# Altium footprint library 逸芬的库鸭.PcbLib: 255 footprints (part 9 of 20)
Each footprint in its own frame and in the unit in brackets; x right, y up, seen from the top. Pads: shape width x height; smd on the part's side, far side on the other; paste and mask are expansions set on the pad; w line width, h text height; cw(c..) or ccw(c..) is an arc to the next point about the centre after c.
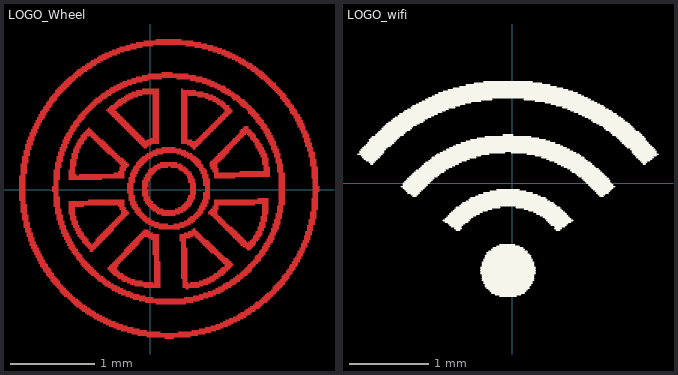
[diagram p8: the footprints below, top view; thin cyan lines are the x and y axes]

## LOGO_Wheel [mm]
Top Layer:
  lines w0.018: -1.554,-0.124 -1.483,-0.124 ; -1.554,-0.107 -1.483,-0.107 ; -1.554,-0.089 -1.483,-0.089 ; -1.554,-0.071 -1.483,-0.071 ; -1.554,-0.053 -1.483,-0.053 ; -1.554,-0.036 -1.483,-0.036 ; -1.554,-0.018 -1.483,-0.018 ; -1.554,0 -1.483,0 ; -1.554,0.018 -1.483,0.018 ; -1.554,0.036 -1.483,0.036 ; -1.554,0.053 -1.483,0.053 ; -1.554,0.071 -1.483,0.071 ; -1.554,0.089 -1.483,0.089 ; -1.554,0.107 -1.483,0.107 ; -1.554,0.124 -1.483,0.124 ; -1.554,0.142 -1.483,0.142 ; -1.554,0.16 -1.483,0.16 ; -1.537,-0.267 -1.466,-0.267 ; -1.537,-0.249 -1.466,-0.249 ; -1.537,-0.231 -1.466,-0.231 ; -1.537,-0.213 -1.466,-0.213 ; -1.537,-0.196 -1.466,-0.196 ; -1.537,-0.178 -1.466,-0.178 ; -1.537,-0.16 -1.483,-0.16 ; -1.537,-0.142 -1.483,-0.142 ; -1.537,0.178 -1.483,0.178 ; -1.537,0.196 -1.466,0.196 ; -1.537,0.213 -1.466,0.213 ; -1.537,0.231 -1.466,0.231 ; -1.537,0.249 -1.466,0.249 ; -1.537,0.267 -1.466,0.267 ; -1.537,0.284 -1.466,0.284 ; -1.537,0.302 -1.466,0.302 ; -1.519,-0.356 -1.448,-0.356 ; -1.519,-0.338 -1.448,-0.338 ; -1.519,-0.32 -1.448,-0.32 ; -1.519,-0.302 -1.448,-0.302 ; -1.519,-0.284 -1.466,-0.284 ; -1.519,0.32 -1.448,0.32 ; -1.519,0.338 -1.448,0.338 ; -1.519,0.356 -1.448,0.356 ; -1.519,0.373 -1.448,0.373 ; -1.519,0.391 -1.448,0.391 ; -1.501,-0.445 -1.43,-0.445 ; -1.501,-0.427 -1.43,-0.427 ; -1.501,-0.409 -1.43,-0.409 ; -1.501,-0.391 -1.43,-0.391 ; -1.501,-0.373 -1.448,-0.373 ; -1.501,0.409 -1.43,0.409 ; -1.501,0.427 -1.43,0.427 ; -1.501,0.445 -1.43,0.445 ; -1.501,0.462 -1.43,0.462 ; -1.483,-0.498 -1.412,-0.498 ; -1.483,-0.48 -1.412,-0.48 ; -1.483,-0.462 -1.412,-0.462 ; -1.483,0.48 -1.412,0.48 ; -1.483,0.498 -1.412,0.498 ; -1.483,0.516 -1.412,0.516 ; -1.483,0.533 -1.394,0.533 ; -1.466,-0.551 -1.394,-0.551 ; -1.466,-0.533 -1.394,-0.533 ; -1.466,-0.516 -1.394,-0.516 ; -1.466,0.551 -1.394,0.551 ; -1.466,0.569 -1.394,0.569 ; -1.466,0.587 -1.377,0.587 ; -1.448,-0.605 -1.377,-0.605 ; -1.448,-0.587 -1.377,-0.587 ; -1.448,-0.569 -1.377,-0.569 ; -1.448,0.605 -1.377,0.605 ; -1.448,0.622 -1.377,0.622 ; -1.43,-0.658 -1.341,-0.658 ; -1.43,-0.64 -1.359,-0.64 ; -1.43,-0.622 -1.359,-0.622 ; -1.43,0.64 -1.359,0.64 ; -1.43,0.658 -1.359,0.658 ; -1.43,0.676 -1.341,0.676 ; -1.412,-0.693 -1.323,-0.693 ; -1.412,-0.676 -1.341,-0.676 ; -1.412,0.693 -1.341,0.693 ; -1.412,0.711 -1.341,0.711 ; -1.394,-0.729 -1.306,-0.729 ; -1.394,-0.711 -1.323,-0.711 ; -1.394,0.729 -1.323,0.729 ; -1.394,0.747 -1.323,0.747 ; -1.377,-0.765 -1.288,-0.765 ; -1.377,-0.747 -1.306,-0.747 ; -1.377,0.765 -1.306,0.765 ; -1.377,0.782 -1.306,0.782 ; -1.359,-0.8 -1.27,-0.8 ; -1.359,-0.782 -1.288,-0.782 ; -1.359,0.8 -1.288,0.8 ; -1.359,0.818 -1.288,0.818 ; -1.341,-0.836 -1.252,-0.836 ; -1.341,-0.818 -1.27,-0.818 ; -1.341,0.836 -1.27,0.836 ; -1.341,0.853 -1.252,0.853 ; -1.323,-0.871 -1.234,-0.871 ; -1.323,-0.853 -1.252,-0.853 ; -1.323,0.871 -1.252,0.871 ; -1.323,0.889 -1.234,0.889 ; -1.306,-0.907 -1.217,-0.907 ; -1.306,-0.889 -1.217,-0.889 ; -1.306,0.907 -1.234,0.907 ; -1.306,0.925 -1.217,0.925 ; -1.288,-0.925 -1.199,-0.925 ; -1.288,0.942 -1.199,0.942 ; -1.27,-0.96 -1.181,-0.96 ; -1.27,-0.942 -1.181,-0.942 ; -1.27,0.96 -1.199,0.96 ; -1.27,0.978 -1.181,0.978 ; -1.252,-0.978 -1.163,-0.978 ; -1.252,0.996 -1.163,0.996 ; -1.234,-1.013 -1.146,-1.013 ; -1.234,-0.996 -1.146,-0.996 ; -1.234,1.013 -1.163,1.013 ; -1.234,1.031 -1.146,1.031 ; -1.217,-1.031 -1.128,-1.031 ; -1.217,1.049 -1.128,1.049 ; -1.199,-1.049 -1.11,-1.049 ; -1.199,1.067 -1.11,1.067 ; -1.199,1.085 -1.11,1.085 ; -1.181,-1.085 -1.074,-1.085 ; -1.181,-1.067 -1.092,-1.067 ; -1.181,1.102 -1.092,1.102 ; -1.163,-1.102 -1.074,-1.102 ; -1.163,-0.018 -1.092,-0.018 ; -1.163,0 -1.092,0 ; -1.163,0.018 -1.092,0.018 ; -1.163,0.036 -1.092,0.036 ; -1.163,1.12 -1.074,1.12 ; -1.146,-1.12 -1.057,-1.12 ; -1.146,-0.196 -1.074,-0.196 ; -1.146,-0.178 -1.074,-0.178 ; -1.146,-0.16 -1.074,-0.16 ; -1.146,-0.142 -1.074,-0.142 ; -1.146,-0.124 -1.074,-0.124 ; -1.146,-0.107 -1.074,-0.107 ; -1.146,-0.089 -1.074,-0.089 ; -1.146,-0.071 -1.092,-0.071 ; -1.146,-0.053 -1.092,-0.053 ; -1.146,-0.036 -1.092,-0.036 ; -1.146,0.053 -1.092,0.053 ; -1.146,0.071 -1.092,0.071 ; -1.146,0.089 -1.092,0.089 ; -1.146,0.107 -1.092,0.107 ; -1.146,0.124 -1.074,0.124 ; -1.146,0.142 -1.074,0.142 ; -1.146,0.16 -1.074,0.16 ; -1.146,0.178 -1.074,0.178 ; -1.146,0.196 -1.074,0.196 ; -1.146,0.213 -1.074,0.213 ; -1.146,0.231 -1.074,0.231 ; -1.146,1.138 -1.057,1.138 ; -1.128,-1.138 -1.039,-1.138 ; -1.128,-0.284 -1.057,-0.284 ; -1.128,-0.267 -1.057,-0.267 ; -1.128,-0.249 -1.057,-0.249 ; -1.128,-0.231 -1.057,-0.231 ; -1.128,-0.213 -1.074,-0.213 ; -1.128,0.249 -1.074,0.249 ; -1.128,0.267 -1.057,0.267 ; -1.128,0.284 -1.057,0.284 ; -1.128,0.302 -1.057,0.302 ; -1.128,0.32 -1.057,0.32 ; -1.128,1.156 -1.039,1.156 ; -1.128,1.173 -1.021,1.173 ; -1.11,-1.156 -1.021,-1.156 ; -1.11,-0.356 -1.039,-0.356 ; -1.11,-0.338 -1.039,-0.338 ; -1.11,-0.32 -1.039,-0.32 ; -1.11,-0.302 -1.039,-0.302 ; -1.11,0.338 -1.039,0.338 ; -1.11,0.356 -1.039,0.356 ; -1.11,0.373 -1.039,0.373 ; -1.11,0.391 -1.039,0.391 ; -1.11,1.191 -1.003,1.191 ; -1.092,-1.173 -1.003,-1.173 ; -1.092,-0.409 -1.021,-0.409 ; -1.092,-0.391 -1.021,-0.391 ; -1.092,-0.373 -1.021,-0.373 ; -1.092,0.409 -1.021,0.409 ; -1.092,0.427 -1.021,0.427 ; -1.092,0.445 -1.021,0.445 ; -1.092,1.209 -0.986,1.209 ; -1.074,-1.209 -0.968,-1.209 ; -1.074,-1.191 -0.986,-1.191 ; -1.074,-0.462 -1.003,-0.462 ; -1.074,-0.445 -1.003,-0.445 ; -1.074,-0.427 -1.003,-0.427 ; -1.074,0.462 -1.003,0.462 ; -1.074,0.48 -1.003,0.48 ; -1.074,0.498 -0.986,0.498 ; -1.074,1.227 -0.968,1.227 ; -1.057,-1.227 -0.95,-1.227 ; -1.057,-0.516 -0.968,-0.516 ; -1.057,-0.498 -0.986,-0.498 ; -1.057,-0.48 -0.986,-0.48 ; -1.057,0.516 -0.986,0.516 ; -1.057,0.533 -0.986,0.533 ; -1.057,1.245 -0.95,1.245 ; -1.039,-1.245 -0.932,-1.245 ; -1.039,-0.551 -0.95,-0.551 ; -1.039,-0.533 -0.968,-0.533 ; -1.039,0.551 -0.968,0.551 ; -1.039,0.569 -0.968,0.569 ; -1.039,0.587 -0.95,0.587 ; -1.039,1.262 -0.932,1.262 ; -1.021,-1.262 -0.914,-1.262 ; -1.021,-0.587 -0.932,-0.587 ; -1.021,-0.569 -0.95,-0.569 ; -1.021,0.605 -0.95,0.605 ; -1.021,0.622 -0.932,0.622 ; -1.021,1.28 -0.914,1.28 ; -1.003,-0.622 -0.914,-0.622 ; -1.003,-0.605 -0.932,-0.605 ; -1.003,0.64 -0.932,0.64 ; -1.003,0.658 -0.914,0.658 ; -1.003,1.298 -0.897,1.298 ; -0.986,-1.28 -0.897,-1.28 ; -0.986,-0.658 -0.897,-0.658 ; -0.986,-0.64 -0.914,-0.64 ; -0.986,0.676 -0.914,0.676 ; -0.986,1.316 -0.879,1.316 ; -0.968,-1.298 -0.861,-1.298 ; -0.968,-0.693 -0.879,-0.693 ; -0.968,-0.676 -0.897,-0.676 ; -0.968,-0.284 -0.897,-0.284 ; -0.968,-0.267 -0.897,-0.267 ; -0.968,-0.249 -0.897,-0.249 ; -0.968,-0.231 -0.897,-0.231 ; -0.968,-0.213 -0.897,-0.213 ; -0.968,-0.196 -0.79,-0.196 ; -0.968,-0.178 -0.31,-0.178 ; -0.968,-0.16 -0.31,-0.16 ; -0.968,-0.142 -0.31,-0.142 ; -0.968,0.124 -0.577,0.124 ; -0.968,0.142 -0.31,0.142 ; -0.968,0.16 -0.31,0.16 ; -0.968,0.178 -0.879,0.178 ; -0.968,0.196 -0.897,0.196 ; -0.968,0.213 -0.897,0.213 ; -0.968,0.231 -0.897,0.231 ; -0.968,0.693 -0.897,0.693 ; -0.968,0.711 -0.879,0.711 ; -0.968,1.333 -0.861,1.333 ; -0.95,-1.316 -0.843,-1.316 ; -0.95,-0.711 -0.861,-0.711 ; -0.95,-0.356 -0.879,-0.356 ; -0.95,-0.338 -0.879,-0.338 ; -0.95,-0.32 -0.879,-0.32 ; -0.95,-0.302 -0.897,-0.302 ; -0.95,0.249 -0.897,0.249 ; -0.95,0.267 -0.897,0.267 ; -0.95,0.284 -0.879,0.284 ; -0.95,0.302 -0.879,0.302 ; -0.95,0.32 -0.879,0.32 ; -0.95,0.338 -0.879,0.338 ; -0.95,0.356 -0.879,0.356 ; -0.95,0.729 -0.879,0.729 ; -0.95,0.747 -0.861,0.747 ; -0.932,-1.333 -0.826,-1.333 ; -0.932,-0.747 -0.843,-0.747 ; -0.932,-0.729 -0.861,-0.729 ; -0.932,-0.409 -0.861,-0.409 ; -0.932,-0.391 -0.861,-0.391 ; -0.932,-0.373 -0.861,-0.373 ; -0.932,0.373 -0.861,0.373 ; -0.932,0.391 -0.861,0.391 ; -0.932,0.409 -0.861,0.409 ; -0.932,0.427 -0.861,0.427 ; -0.932,0.765 -0.843,0.765 ; -0.932,1.351 -0.826,1.351 ; -0.914,-1.351 -0.808,-1.351 ; -0.914,-0.765 -0.826,-0.765 ; -0.914,-0.445 -0.843,-0.445 ; -0.914,-0.427 -0.843,-0.427 ; -0.914,0.445 -0.843,0.445 ; -0.914,0.462 -0.843,0.462 ; -0.914,0.48 -0.843,0.48 ; -0.914,0.782 -0.843,0.782 ; -0.914,0.8 -0.826,0.8 ; -0.914,1.369 -0.808,1.369 ; -0.897,-1.369 -0.772,-1.369 ; -0.897,-0.782 -0.808,-0.782 ; -0.897,-0.48 -0.826,-0.48 ; -0.897,-0.462 -0.826,-0.462 ; -0.897,0.498 -0.826,0.498 ; -0.897,0.516 -0.826,0.516 ; -0.897,0.818 -0.808,0.818 ; -0.897,1.387 -0.79,1.387 ; -0.879,-1.387 -0.754,-1.387 ; -0.879,-0.818 -0.79,-0.818 ; -0.879,-0.8 -0.808,-0.8 ; -0.879,-0.516 -0.79,-0.516 ; -0.879,-0.498 -0.808,-0.498 ; -0.879,0.533 -0.808,0.533 ; -0.879,0.551 -0.79,0.551 ; -0.879,0.836 -0.79,0.836 ; -0.879,1.405 -0.754,1.405 ; -0.861,-0.836 -0.772,-0.836 ; -0.861,-0.551 -0.772,-0.551 ; -0.861,-0.533 -0.79,-0.533 ; -0.861,0.569 -0.79,0.569 ; -0.861,0.587 -0.772,0.587 ; -0.861,0.853 -0.772,0.853 ; -0.861,0.871 -0.772,0.871 ; -0.861,1.422 -0.737,1.422 ; -0.843,-1.405 -0.719,-1.405 ; -0.843,-0.853 -0.754,-0.853 ; -0.843,-0.569 -0.754,-0.569 ; -0.843,0.178 -0.31,0.178 ; -0.843,0.605 -0.754,0.605 ; -0.843,0.889 -0.754,0.889 ; -0.826,-1.422 -0.701,-1.422 ; -0.826,-0.889 -0.719,-0.889 ; -0.826,-0.871 -0.737,-0.871 ; -0.826,-0.587 -0.737,-0.587 ; -0.826,0.622 -0.754,0.622 ; -0.826,0.64 -0.63,0.64 ; -0.826,0.907 -0.737,0.907 ; -0.826,1.44 -0.701,1.44 ; -0.808,-1.44 -0.665,-1.44 ; -0.808,-0.907 -0.701,-0.907 ; -0.808,-0.622 -0.719,-0.622 ; -0.808,-0.605 -0.737,-0.605 ; -0.808,0.658 -0.648,0.658 ; -0.808,0.925 -0.719,0.925 ; -0.808,1.458 -0.683,1.458 ; -0.79,-0.925 -0.683,-0.925 ; -0.79,-0.64 -0.701,-0.64 ; -0.79,0.676 -0.665,0.676 ; -0.79,0.942 -0.701,0.942 ; -0.772,-1.458 -0.648,-1.458 ; -0.772,-0.942 -0.665,-0.942 ; -0.772,-0.658 -0.612,-0.658 ; -0.772,0.693 -0.683,0.693 ; -0.772,0.96 -0.683,0.96 ; -0.772,1.476 -0.648,1.476 ; -0.754,-1.476 -0.612,-1.476 ; -0.754,-0.96 -0.648,-0.96 ; -0.754,-0.676 -0.63,-0.676 ; -0.754,0.711 -0.701,0.711 ; -0.754,0.978 -0.665,0.978 ; -0.754,1.494 -0.63,1.494 ; -0.737,-0.978 -0.63,-0.978 ; -0.737,-0.693 -0.648,-0.693 ; -0.737,-0.124 -0.31,-0.124 ; -0.737,0.729 -0.719,0.729 ; -0.737,0.996 -0.648,0.996 ; -0.719,-1.494 -0.577,-1.494 ; -0.719,-0.996 -0.612,-0.996 ; -0.719,-0.729 -0.683,-0.729 ; -0.719,-0.711 -0.665,-0.711 ; -0.719,1.013 -0.63,1.013 ; -0.719,1.511 -0.594,1.511 ; -0.701,-1.013 -0.594,-1.013 ; -0.701,0.622 -0.612,0.622 ; -0.701,1.031 -0.594,1.031 ; -0.701,1.529 -0.559,1.529 ; -0.683,-1.511 -0.541,-1.511 ; -0.683,-0.64 -0.594,-0.64 ; -0.683,0.605 -0.594,0.605 ; -0.683,1.049 -0.577,1.049 ; -0.665,-1.529 -0.505,-1.529 ; -0.665,-1.031 -0.559,-1.031 ; -0.665,-0.622 -0.577,-0.622 ; -0.665,0.587 -0.559,0.587 ; -0.665,1.067 -0.559,1.067 ; -0.665,1.547 -0.523,1.547 ; -0.648,-1.049 -0.541,-1.049 ; -0.648,-0.605 -0.559,-0.605 ; -0.648,-0.587 -0.541,-0.587 ; -0.648,0.569 -0.541,0.569 ; -0.648,1.085 -0.523,1.085 ; -0.63,-1.547 -0.47,-1.547 ; -0.63,-1.067 -0.523,-1.067 ; -0.63,-0.569 -0.523,-0.569 ; -0.63,0.551 -0.523,0.551 ; -0.63,1.565 -0.488,1.565 ; -0.612,-1.085 -0.488,-1.085 ; -0.612,-0.551 -0.505,-0.551 ; -0.612,0.533 -0.505,0.533 ; -0.612,1.102 -0.505,1.102 ; -0.612,1.582 -0.452,1.582 ; -0.594,-1.565 -0.417,-1.565 ; -0.594,-0.533 -0.488,-0.533 ; -0.594,0.516 -0.488,0.516 ; -0.594,1.12 -0.47,1.12 ; -0.577,-1.102 -0.47,-1.102 ; -0.577,-0.516 -0.47,-0.516 ; -0.577,0.498 -0.47,0.498 ; -0.577,1.138 -0.452,1.138 ; -0.577,1.6 -0.399,1.6 ; -0.559,-1.582 -0.381,-1.582 ; -0.559,-1.12 -0.434,-1.12 ; -0.559,-0.498 -0.452,-0.498 ; -0.559,0.48 -0.452,0.48 ; -0.541,-1.138 -0.399,-1.138 ; -0.541,-0.48 -0.434,-0.48 ; -0.541,0.462 -0.434,0.462 ; -0.541,1.156 -0.417,1.156 ; -0.541,1.618 -0.363,1.618 ; -0.523,-1.6 -0.328,-1.6 ; -0.523,-0.462 -0.434,-0.462 ; -0.523,0.445 -0.417,0.445 ; -0.523,0.942 -0.417,0.942 ; -0.523,1.173 -0.381,1.173 ; -0.505,-1.156 -0.363,-1.156 ; -0.505,-0.942 -0.399,-0.942 ; -0.505,-0.925 -0.399,-0.925 ; -0.505,-0.445 -0.417,-0.445 ; -0.505,0.427 -0.399,0.427 ; -0.505,0.925 -0.399,0.925 ; -0.505,0.96 -0.399,0.96 ; -0.488,-1.618 -0.274,-1.618 ; -0.488,-0.96 -0.381,-0.96 ; -0.488,-0.907 -0.381,-0.907 ; -0.488,-0.427 -0.399,-0.427 ; -0.488,0.907 -0.381,0.907 ; -0.488,0.978 -0.381,0.978 ; -0.488,1.191 -0.345,1.191 ; -0.488,1.636 -0.31,1.636 ; -0.47,-1.173 -0.328,-1.173 ; -0.47,-0.978 -0.363,-0.978 ; -0.47,-0.889 -0.381,-0.889 ; -0.47,-0.409 -0.381,-0.409 ; -0.47,0.409 -0.381,0.409 ; -0.47,0.889 -0.363,0.889 ; -0.47,0.996 -0.345,0.996 ; -0.47,1.209 -0.31,1.209 ; -0.452,-1.191 -0.292,-1.191 ; -0.452,-0.996 -0.328,-0.996 ; -0.452,-0.871 -0.363,-0.871 ; -0.452,-0.391 -0.363,-0.391 ; -0.452,0.391 -0.363,0.391 ; -0.452,0.871 -0.345,0.871 ; -0.452,1.654 -0.239,1.654 ; -0.434,-1.636 -0.203,-1.636 ; -0.434,-1.013 -0.31,-1.013 ; -0.434,-0.853 -0.345,-0.853 ; -0.434,-0.373 -0.345,-0.373 ; -0.434,0.196 -0.31,0.196 ; -0.434,0.373 -0.328,0.373 ; -0.434,0.853 -0.328,0.853 ; -0.434,1.013 -0.328,1.013 ; -0.434,1.227 -0.274,1.227 ; -0.417,-1.209 -0.239,-1.209 ; -0.417,-0.836 -0.328,-0.836 ; -0.417,-0.356 -0.328,-0.356 ; -0.417,0.356 -0.31,0.356 ; -0.417,0.836 -0.31,0.836 ; -0.417,1.031 -0.292,1.031 ; -0.399,-1.654 -0.132,-1.654 ; -0.399,-1.031 -0.274,-1.031 ; -0.399,-0.818 -0.31,-0.818 ; -0.399,-0.338 -0.31,-0.338 ; -0.399,0.338 -0.292,0.338 ; -0.399,0.818 -0.292,0.818 ; -0.399,1.049 -0.274,1.049 ; -0.399,1.245 -0.221,1.245 ; -0.399,1.671 -0.168,1.671 ; -0.381,-1.227 -0.203,-1.227 ; -0.381,-1.049 -0.239,-1.049 ; -0.381,-0.8 -0.292,-0.8 ; -0.381,-0.32 -0.292,-0.32 ; -0.381,-0.196 -0.31,-0.196 ; -0.381,0.213 -0.31,0.213 ; -0.381,0.32 -0.274,0.32 ; -0.381,0.8 -0.274,0.8 ; -0.381,1.067 -0.239,1.067 ; -0.363,-0.782 -0.274,-0.782 ; -0.363,-0.302 -0.274,-0.302 ; -0.363,-0.231 -0.292,-0.231 ; -0.363,-0.213 -0.292,-0.213 ; -0.363,0.231 -0.292,0.231 ; -0.363,0.249 -0.292,0.249 ; -0.363,0.267 -0.274,0.267 ; -0.363,0.302 -0.257,0.302 ; -0.363,0.782 -0.257,0.782 ; -0.363,1.262 -0.168,1.262 ; -0.363,1.689 -0.097,1.689 ; -0.345,-1.671 -0.043,-1.671 ; -0.345,-1.245 -0.132,-1.245 ; -0.345,-1.067 -0.185,-1.067 ; -0.345,-0.765 -0.257,-0.765 ; -0.345,-0.284 -0.257,-0.284 ; -0.345,-0.267 -0.257,-0.267 ; -0.345,-0.249 -0.274,-0.249 ; -0.345,0.284 -0.257,0.284 ; -0.345,0.765 -0.239,0.765 ; -0.345,1.085 -0.203,1.085 ; -0.328,-1.085 -0.097,-1.085 ; -0.328,-0.747 -0.239,-0.747 ; -0.328,0.747 -0.221,0.747 ; -0.328,1.28 -0.097,1.28 ; -0.31,-0.729 -0.221,-0.729 ; -0.31,-0.711 -0.203,-0.711 ; -0.31,0.729 -0.203,0.729 ; -0.31,1.102 -0.15,1.102 ; -0.292,-1.262 -0.061,-1.262 ; -0.292,-0.693 -0.185,-0.693 ; -0.292,0.711 -0.185,0.711 ; -0.292,1.12 -0.097,1.12 ; -0.292,1.707 0.028,1.707 ; -0.274,-1.689 0.117,-1.689 ; -0.274,-1.102 0.028,-1.102 ; -0.274,-0.676 -0.168,-0.676 ; -0.274,-0.036 -0.203,-0.036 ; -0.274,-0.018 -0.203,-0.018 ; -0.274,0 -0.203,0 ; -0.274,0.018 -0.203,0.018 ; -0.274,0.036 -0.203,0.036 ; -0.274,0.053 -0.203,0.053 ; -0.274,0.071 -0.203,0.071 ; -0.274,0.693 -0.168,0.693 ; -0.274,1.298 -0.025,1.298 ; -0.257,-0.658 -0.15,-0.658 ; -0.257,-0.124 -0.185,-0.124 ; -0.257,-0.107 -0.185,-0.107 ; -0.257,-0.089 -0.185,-0.089 ; -0.257,-0.071 -0.185,-0.071 ; -0.257,-0.053 -0.203,-0.053 ; -0.257,0.089 -0.185,0.089 ; -0.257,0.107 -0.185,0.107 ; -0.257,0.124 -0.185,0.124 ; -0.257,0.142 -0.185,0.142 ; -0.257,0.676 -0.15,0.676 ; -0.257,1.138 0.099,1.138 ; -0.239,-1.28 0.028,-1.28 ; -0.239,-1.12 0.117,-1.12 ; -0.239,-0.64 -0.132,-0.64 ; -0.239,-0.178 -0.15,-0.178 ; -0.239,-0.16 -0.168,-0.16 ; -0.239,-0.142 -0.168,-0.142 ; -0.239,0.16 -0.168,0.16 ; -0.239,0.178 -0.168,0.178 ; -0.239,0.196 -0.15,0.196 ; -0.239,0.658 -0.132,0.658 ; -0.239,1.725 0.668,1.725 ; -0.221,-1.707 0.65,-1.707 ; -0.221,-0.622 -0.132,-0.622 ; -0.221,-0.213 -0.132,-0.213 ; -0.221,-0.196 -0.15,-0.196 ; -0.221,0.213 -0.15,0.213 ; -0.221,0.231 -0.132,0.231 ; -0.221,0.64 -0.114,0.64 ; -0.221,1.156 0.099,1.156 ; -0.221,1.316 0.135,1.316 ; -0.203,-1.298 0.632,-1.298 ; -0.203,-0.605 -0.114,-0.605 ; -0.203,-0.231 -0.114,-0.231 ; -0.203,0.249 -0.132,0.249 ; -0.203,0.267 -0.114,0.267 ; -0.203,0.622 -0.097,0.622 ; -0.185,-1.138 0.117,-1.138 ; -0.185,-0.587 -0.097,-0.587 ; -0.185,-0.267 -0.097,-0.267 ; -0.185,-0.249 -0.114,-0.249 ; -0.185,0.284 -0.097,0.284 ; -0.185,0.605 -0.079,0.605 ; -0.168,-0.569 -0.079,-0.569 ; -0.168,-0.284 -0.079,-0.284 ; -0.168,0.302 -0.079,0.302 ; -0.168,0.32 -0.061,0.32 ; -0.168,0.587 -0.061,0.587 ; -0.168,1.173 0.099,1.173 ; -0.168,1.333 0.615,1.333 ; -0.168,1.742 0.597,1.742 ; -0.15,-1.725 0.561,-1.725 ; -0.15,-0.551 0.099,-0.551 ; -0.15,-0.302 -0.061,-0.302 ; -0.15,0.338 -0.043,0.338 ; -0.15,0.569 0.099,0.569 ; -0.132,-1.316 0.579,-1.316 ; -0.132,-0.533 0.099,-0.533 ; -0.132,-0.32 -0.043,-0.32 ; -0.132,0.356 -0.025,0.356 ; -0.132,0.551 0.099,0.551 ; -0.114,-0.516 0.028,-0.516 ; -0.114,-0.338 -0.008,-0.338 ; -0.114,0.373 0.01,0.373 ; -0.114,0.533 0.01,0.533 ; -0.097,-0.498 -0.008,-0.498 ; -0.097,-0.356 0.01,-0.356 ; -0.097,-0.071 -0.025,-0.071 ; -0.097,-0.053 -0.025,-0.053 ; -0.097,-0.036 -0.025,-0.036 ; -0.097,-0.018 -0.025,-0.018 ; -0.097,0 -0.025,0 ; -0.097,0.018 -0.043,0.018 ; -0.097,0.036 -0.025,0.036 ; -0.097,0.053 -0.025,0.053 ; -0.097,0.071 -0.025,0.071 ; -0.097,0.089 -0.025,0.089 ; -0.097,0.107 -0.008,0.107 ; -0.097,0.391 0.028,0.391 ; -0.097,0.516 -0.025,0.516 ; -0.097,1.191 0.099,1.191 ; -0.097,1.351 0.544,1.351 ; -0.079,-1.156 0.117,-1.156 ; -0.079,-0.48 -0.025,-0.48 ; -0.079,-0.373 0.046,-0.373 ; -0.079,-0.124 0.01,-0.124 ; -0.079,-0.107 -0.008,-0.107 ; -0.079,-0.089 -0.008,-0.089 ; -0.079,0.124 -0.008,0.124 ; -0.079,0.142 0.01,0.142 ; -0.079,0.498 -0.043,0.498 ; -0.079,1.76 0.508,1.76 ; -0.061,-1.333 0.508,-1.333 ; -0.061,-0.391 0.099,-0.391 ; -0.061,-0.16 0.028,-0.16 ; -0.061,-0.142 0.028,-0.142 ; -0.061,0.16 0.01,0.16 ; -0.061,0.178 0.028,0.178 ; -0.061,0.409 0.081,0.409 ; -0.043,-1.742 0.472,-1.742 ; -0.043,-0.178 0.064,-0.178 ; -0.043,0.196 0.046,0.196 ; -0.043,0.427 0.152,0.427 ; -0.043,0.587 0.099,0.587 ; -0.025,-0.569 0.099,-0.569 ; -0.025,-0.409 0.206,-0.409 ; -0.025,-0.196 0.081,-0.196 ; -0.025,0.213 0.064,0.213 ; -0.025,0.231 0.081,0.231 ; -0.025,1.369 0.455,1.369 ; -0.008,-0.213 0.099,-0.213 ; -0.008,0.249 0.117,0.249 ; -0.008,0.445 0.455,0.445 ; -0.008,0.605 0.099,0.605 ; 0.01,-0.587 0.099,-0.587 ; 0.01,-0.427 0.437,-0.427 ; 0.01,-0.231 0.152,-0.231 ; 0.028,-0.765 0.099,-0.765 ; 0.028,-0.747 0.099,-0.747 ; 0.028,-0.729 0.099,-0.729 ; 0.028,-0.711 0.099,-0.711 ; 0.028,-0.693 0.099,-0.693 ; 0.028,-0.676 0.099,-0.676 ; 0.028,-0.658 0.099,-0.658 ; 0.028,-0.64 0.099,-0.64 ; 0.028,-0.622 0.099,-0.622 ; 0.028,-0.605 0.099,-0.605 ; 0.028,-0.249 0.419,-0.249 ; 0.028,0.267 0.206,0.267 ; 0.028,0.462 0.419,0.462 ; 0.028,0.622 0.099,0.622 ; 0.028,0.64 0.099,0.64 ; 0.028,0.658 0.099,0.658 ; 0.028,0.676 0.099,0.676 ; 0.028,0.693 0.099,0.693 ; 0.028,0.711 0.099,0.711 ; 0.028,0.729 0.099,0.729 ; 0.028,0.747 0.099,0.747 ; 0.028,0.765 0.099,0.765 ; 0.028,0.782 0.099,0.782 ; 0.028,0.8 0.099,0.8 ; 0.028,0.818 0.099,0.818 ; 0.028,0.836 0.099,0.836 ; 0.028,0.853 0.099,0.853 ; 0.028,0.871 0.099,0.871 ; 0.028,0.889 0.099,0.889 ; 0.028,0.907 0.099,0.907 ; 0.028,0.925 0.099,0.925 ; 0.028,0.942 0.099,0.942 ; 0.028,0.96 0.099,0.96 ; 0.028,0.978 0.099,0.978 ; 0.028,0.996 0.099,0.996 ; 0.028,1.013 0.099,1.013 ; 0.028,1.031 0.099,1.031 ; 0.028,1.049 0.099,1.049 ; 0.028,1.067 0.099,1.067 ; 0.028,1.085 0.099,1.085 ; 0.028,1.102 0.099,1.102 ; 0.028,1.12 0.099,1.12 ; 0.046,-1.102 0.117,-1.102 ; 0.046,-1.085 0.117,-1.085 ; 0.046,-1.067 0.117,-1.067 ; 0.046,-1.049 0.117,-1.049 ; 0.046,-1.031 0.117,-1.031 ; 0.046,-1.013 0.117,-1.013 ; 0.046,-0.996 0.117,-0.996 ; 0.046,-0.978 0.117,-0.978 ; 0.046,-0.96 0.117,-0.96 ; 0.046,-0.942 0.117,-0.942 ; 0.046,-0.925 0.117,-0.925 ; 0.046,-0.907 0.117,-0.907 ; 0.046,-0.889 0.117,-0.889 ; 0.046,-0.871 0.117,-0.871 ; 0.046,-0.853 0.117,-0.853 ; 0.046,-0.836 0.099,-0.836 ; 0.046,-0.818 0.099,-0.818 ; 0.046,-0.8 0.099,-0.8 ; 0.046,-0.782 0.099,-0.782 ; 0.046,-0.445 0.401,-0.445 ; 0.046,0.284 0.384,0.284 ; 0.064,-1.351 0.419,-1.351 ; 0.064,-0.267 0.384,-0.267 ; 0.064,0.48 0.366,0.48 ; 0.064,1.778 0.366,1.778 ; 0.081,-0.284 0.348,-0.284 ; 0.081,0.302 0.366,0.302 ; 0.099,-0.462 0.348,-0.462 ; 0.117,0.32 0.312,0.32 ; 0.135,-0.302 0.295,-0.302 ; 0.135,0.498 0.295,0.498 ; 0.135,1.387 0.259,1.387 ; 0.17,-1.76 0.277,-1.76 ; 0.241,0.267 0.419,0.267 ; 0.277,-0.409 0.472,-0.409 ; 0.295,-0.231 0.437,-0.231 ; 0.312,0.427 0.49,0.427 ; 0.312,1.316 0.668,1.316 ; 0.33,-1.689 0.721,-1.689 ; 0.33,-0.213 0.455,-0.213 ; 0.33,0.249 0.437,0.249 ; 0.348,-0.605 0.419,-0.605 ; 0.348,-0.587 0.419,-0.587 ; 0.348,-0.569 0.472,-0.569 ; 0.348,-0.551 0.508,-0.551 ; 0.348,-0.533 0.597,-0.533 ; 0.348,-0.391 0.508,-0.391 ; 0.348,0.231 0.455,0.231 ; 0.366,-1.049 0.437,-1.049 ; 0.366,-1.031 0.437,-1.031 ; 0.366,-1.013 0.437,-1.013 ; 0.366,-0.996 0.437,-0.996 ; 0.366,-0.978 0.437,-0.978 ; 0.366,-0.96 0.437,-0.96 ; 0.366,-0.942 0.437,-0.942 ; 0.366,-0.925 0.437,-0.925 ; 0.366,-0.907 0.437,-0.907 ; 0.366,-0.889 0.437,-0.889 ; 0.366,-0.871 0.437,-0.871 ; 0.366,-0.853 0.437,-0.853 ; 0.366,-0.836 0.437,-0.836 ; 0.366,-0.818 0.437,-0.818 ; 0.366,-0.8 0.437,-0.8 ; 0.366,-0.782 0.437,-0.782 ; 0.366,-0.765 0.437,-0.765 ; 0.366,-0.747 0.437,-0.747 ; 0.366,-0.729 0.437,-0.729 ; 0.366,-0.711 0.437,-0.711 ; 0.366,-0.693 0.437,-0.693 ; 0.366,-0.676 0.419,-0.676 ; 0.366,-0.658 0.419,-0.658 ; 0.366,-0.64 0.419,-0.64 ; 0.366,-0.622 0.419,-0.622 ; 0.366,-0.196 0.472,-0.196 ; 0.366,0.409 0.508,0.409 ; 0.366,0.551 0.597,0.551 ; 0.366,0.569 0.615,0.569 ; 0.366,0.587 0.49,0.587 ; 0.366,0.605 0.437,0.605 ; 0.366,0.622 0.437,0.622 ; 0.366,0.64 0.437,0.64 ; 0.366,0.658 0.437,0.658 ; 0.366,0.676 0.437,0.676 ; 0.366,0.693 0.437,0.693 ; 0.366,0.711 0.437,0.711 ; 0.366,0.729 0.437,0.729 ; 0.366,0.747 0.437,0.747 ; 0.366,0.765 0.437,0.765 ; 0.366,0.782 0.437,0.782 ; 0.366,0.8 0.437,0.8 ; 0.366,0.818 0.437,0.818 ; 0.366,0.836 0.437,0.836 ; 0.366,0.853 0.437,0.853 ; 0.366,0.871 0.437,0.871 ; 0.366,0.889 0.437,0.889 ; 0.366,0.907 0.437,0.907 ; 0.366,0.925 0.437,0.925 ; 0.366,0.942 0.437,0.942 ; 0.366,0.96 0.437,0.96 ; 0.366,0.978 0.437,0.978 ; 0.366,0.996 0.437,0.996 ; 0.366,1.013 0.437,1.013 ; 0.366,1.031 0.437,1.031 ; 0.366,1.049 0.437,1.049 ; 0.366,1.067 0.437,1.067 ; 0.366,1.085 0.437,1.085 ; 0.366,1.102 0.437,1.102 ; 0.366,1.12 0.437,1.12 ; 0.366,1.138 0.686,1.138 ; 0.366,1.156 0.632,1.156 ; 0.366,1.173 0.544,1.173 ; 0.366,1.191 0.384,1.191 ; 0.384,-1.156 0.579,-1.156 ; 0.384,-1.138 0.632,-1.138 ; 0.384,-1.12 0.686,-1.12 ; 0.384,-1.102 0.455,-1.102 ; 0.384,-1.085 0.437,-1.085 ; 0.384,-1.067 0.437,-1.067 ; 0.384,-0.178 0.49,-0.178 ; 0.384,0.213 0.472,0.213 ; 0.401,-1.28 0.686,-1.28 ; 0.401,-0.516 0.579,-0.516 ; 0.401,-0.373 0.526,-0.373 ; 0.401,-0.16 0.49,-0.16 ; 0.401,0.196 0.49,0.196 ; 0.401,0.391 0.544,0.391 ; 0.419,-1.173 0.455,-1.173 ; 0.419,-0.142 0.508,-0.142 ; 0.419,0.178 0.49,0.178 ; 0.419,1.707 0.739,1.707 ; 0.437,-0.356 0.544,-0.356 ; 0.437,-0.124 0.508,-0.124 ; 0.437,-0.107 0.526,-0.107 ; 0.437,0.142 0.508,0.142 ; 0.437,0.16 0.508,0.16 ; 0.437,0.373 0.561,0.373 ; 0.437,0.533 0.579,0.533 ; 0.455,-0.498 0.561,-0.498 ; 0.455,-0.338 0.561,-0.338 ; 0.455,-0.089 0.526,-0.089 ; 0.455,-0.071 0.526,-0.071 ; 0.455,0.089 0.526,0.089 ; 0.455,0.107 0.526,0.107 ; 0.455,0.124 0.526,0.124 ; 0.455,1.12 0.739,1.12 ; 0.472,-1.102 0.721,-1.102 ; 0.472,-0.32 0.579,-0.32 ; 0.472,-0.053 0.544,-0.053 ; 0.472,-0.036 0.544,-0.036 ; 0.472,-0.018 0.544,-0.018 ; 0.472,0 0.544,0 ; 0.472,0.018 0.544,0.018 ; 0.472,0.036 0.544,0.036 ; 0.472,0.053 0.544,0.053 ; 0.472,0.071 0.544,0.071 ; 0.472,0.356 0.579,0.356 ; 0.472,0.516 0.561,0.516 ; 0.472,1.298 0.721,1.298 ; 0.49,-1.671 0.775,-1.671 ; 0.49,-0.48 0.544,-0.48 ; 0.49,0.338 0.597,0.338 ; 0.49,0.498 0.544,0.498 ; 0.508,-1.262 0.739,-1.262 ; 0.508,-0.462 0.526,-0.462 ; 0.508,-0.302 0.597,-0.302 ; 0.508,0.32 0.597,0.32 ; 0.508,0.48 0.526,0.48 ; 0.526,-0.551 0.615,-0.551 ; 0.526,-0.284 0.615,-0.284 ; 0.526,0.302 0.615,0.302 ; 0.526,1.689 0.792,1.689 ; 0.544,-0.569 0.632,-0.569 ; 0.544,-0.267 0.632,-0.267 ; 0.544,0.284 0.632,0.284 ; 0.544,0.587 0.632,0.587 ; 0.544,1.28 0.757,1.28 ; 0.561,-0.587 0.65,-0.587 ; 0.561,-0.249 0.632,-0.249 ; 0.561,-0.231 0.65,-0.231 ; 0.561,0.267 0.632,0.267 ; 0.561,0.605 0.65,0.605 ; 0.561,1.102 0.775,1.102 ; 0.579,-1.654 0.828,-1.654 ; 0.579,-1.245 0.775,-1.245 ; 0.579,-1.085 0.757,-1.085 ; 0.579,-0.605 0.686,-0.605 ; 0.579,-0.213 0.65,-0.213 ; 0.579,-0.196 0.668,-0.196 ; 0.579,0.231 0.668,0.231 ; 0.579,0.249 0.65,0.249 ; 0.579,0.622 0.668,0.622 ; 0.597,-0.622 0.704,-0.622 ; 0.597,-0.178 0.668,-0.178 ; 0.597,-0.16 0.686,-0.16 ; 0.597,0.196 0.668,0.196 ; 0.597,0.213 0.668,0.213 ; 0.597,0.64 0.686,0.64 ; 0.615,-0.64 0.721,-0.64 ; 0.615,-0.142 0.686,-0.142 ; 0.615,-0.124 0.686,-0.124 ; 0.615,0.142 0.686,0.142 ; 0.615,0.16 0.686,0.16 ; 0.615,0.178 0.686,0.178 ; 0.615,0.658 0.704,0.658 ; 0.615,1.262 0.792,1.262 ; 0.615,1.671 0.846,1.671 ; 0.632,-1.227 0.828,-1.227 ; 0.632,-1.067 0.775,-1.067 ; 0.632,-0.658 0.739,-0.658 ; 0.632,-0.107 0.704,-0.107 ; 0.632,-0.089 0.704,-0.089 ; 0.632,-0.071 0.704,-0.071 ; 0.632,-0.053 0.704,-0.053 ; 0.632,-0.036 0.704,-0.036 ; 0.632,0.053 0.704,0.053 ; 0.632,0.071 0.704,0.071 ; 0.632,0.089 0.704,0.089 ; 0.632,0.107 0.704,0.107 ; 0.632,0.124 0.704,0.124 ; 0.632,0.676 0.721,0.676 ; 0.65,-1.636 0.864,-1.636 ; 0.65,-0.676 0.757,-0.676 ; 0.65,-0.018 0.704,-0.018 ; 0.65,0 0.704,0 ; 0.65,0.018 0.704,0.018 ; 0.65,0.036 0.704,0.036 ; 0.65,0.693 0.739,0.693 ; 0.65,1.085 0.81,1.085 ; 0.668,-1.049 0.81,-1.049 ; 0.668,-0.693 0.775,-0.693 ; 0.668,0.711 0.757,0.711 ; 0.668,1.245 0.828,1.245 ; 0.686,-1.209 0.864,-1.209 ; 0.686,-0.711 0.792,-0.711 ; 0.686,-0.284 0.792,-0.284 ; 0.686,-0.267 0.792,-0.267 ; 0.686,0.729 0.775,0.729 ; 0.686,1.067 0.828,1.067 ; 0.686,1.654 0.899,1.654 ; 0.704,-1.031 0.828,-1.031 ; 0.704,-0.729 0.81,-0.729 ; 0.704,-0.249 0.792,-0.249 ; 0.704,0.284 0.792,0.284 ; 0.704,0.302 0.792,0.302 ; 0.704,0.32 0.81,0.32 ; 0.704,0.747 0.792,0.747 ; 0.704,1.227 0.881,1.227 ; 0.721,-1.618 0.917,-1.618 ; 0.721,-0.747 0.828,-0.747 ; 0.721,-0.302 0.81,-0.302 ; 0.721,-0.231 0.81,-0.231 ; 0.721,0.249 0.81,0.249 ; 0.721,0.267 0.792,0.267 ; 0.721,0.338 0.828,0.338 ; 0.721,0.765 0.81,0.765 ; 0.739,-1.191 0.881,-1.191 ; 0.739,-1.013 0.864,-1.013 ; 0.739,-0.32 0.828,-0.32 ; 0.739,-0.213 0.81,-0.213 ; 0.739,-0.196 0.81,-0.196 ; 0.739,0.213 0.81,0.213 ; 0.739,0.231 0.81,0.231 ; 0.739,0.356 0.846,0.356 ; 0.739,0.782 0.828,0.782 ; 0.739,1.049 0.864,1.049 ; 0.739,1.636 0.935,1.636 ; 0.757,-0.996 0.881,-0.996 ; 0.757,-0.765 0.846,-0.765 ; 0.757,-0.338 0.846,-0.338 ; 0.757,-0.178 1.237,-0.178 ; 0.757,-0.16 1.397,-0.16 ; 0.757,-0.142 1.397,-0.142 ; 0.757,-0.124 1.397,-0.124 ; 0.757,0.142 1.006,0.142 ; 0.757,0.16 1.415,0.16 ; 0.757,0.178 1.415,0.178 ; 0.757,0.196 1.415,0.196 ; 0.757,0.373 0.864,0.373 ; 0.757,0.8 0.846,0.8 ; 0.757,1.209 0.899,1.209 ; 0.775,-1.6 0.953,-1.6 ; 0.775,-1.173 0.917,-1.173 ; 0.775,-0.782 0.864,-0.782 ; 0.775,-0.356 0.864,-0.356 ; 0.775,0.391 0.881,0.391 ; 0.775,0.818 0.864,0.818 ; 0.775,1.031 0.881,1.031 ; 0.792,-0.978 0.899,-0.978 ; 0.792,-0.8 0.881,-0.8 ; 0.792,-0.373 0.881,-0.373 ; 0.792,0.409 0.899,0.409 ; 0.792,0.836 0.881,0.836 ; 0.792,1.013 0.899,1.013 ; 0.792,1.191 0.935,1.191 ; 0.792,1.618 0.97,1.618 ; 0.81,-1.156 0.953,-1.156 ; 0.81,-0.96 0.917,-0.96 ; 0.81,-0.818 0.917,-0.818 ; 0.81,-0.391 0.899,-0.391 ; 0.81,0.427 0.917,0.427 ; 0.81,0.853 0.899,0.853 ; 0.828,-1.582 0.988,-1.582 ; 0.828,-0.942 0.935,-0.942 ; 0.828,-0.836 0.935,-0.836 ; 0.828,-0.409 0.917,-0.409 ; 0.828,0.445 0.935,0.445 ; 0.828,0.871 0.917,0.871 ; 0.828,0.996 0.935,0.996 ; 0.828,1.173 0.953,1.173 ; 0.846,-1.138 0.97,-1.138 ; 0.846,-0.925 0.953,-0.925 ; 0.846,-0.853 0.953,-0.853 ; 0.846,-0.427 0.935,-0.427 ; 0.846,0.462 0.935,0.462 ; 0.846,0.889 0.935,0.889 ; 0.846,0.978 0.935,0.978 ; 0.846,1.156 0.988,1.156 ; 0.846,1.6 1.006,1.6 ; 0.864,-1.565 1.024,-1.565 ; 0.864,-1.12 1.006,-1.12 ; 0.864,-0.871 0.97,-0.871 ; 0.864,-0.445 0.97,-0.445 ; 0.864,0.48 0.953,0.48 ; 0.864,0.907 0.953,0.907 ; 0.864,0.96 0.953,0.96 ; 0.881,-0.907 0.97,-0.907 ; 0.881,-0.889 0.988,-0.889 ; 0.881,-0.462 0.988,-0.462 ; 0.881,0.498 0.97,0.498 ; 0.881,0.925 0.97,0.925 ; 0.881,0.942 0.97,0.942 ; 0.881,1.138 1.006,1.138 ; 0.881,1.582 1.041,1.582 ; 0.899,-1.547 1.059,-1.547 ; 0.899,-1.102 1.024,-1.102 ; 0.899,-0.48 1.006,-0.48 ; 0.899,0.516 0.988,0.516 ; 0.917,-0.498 1.024,-0.498 ; 0.917,0.533 1.006,0.533 ; 0.917,1.12 1.041,1.12 ; 0.917,1.565 1.077,1.565 ; 0.935,-1.529 1.095,-1.529 ; 0.935,-1.085 1.059,-1.085 ; 0.935,-0.516 1.041,-0.516 ; 0.935,0.551 1.024,0.551 ; 0.953,-1.067 1.077,-1.067 ; 0.953,-0.533 1.059,-0.533 ; 0.953,0.569 1.041,0.569 ; 0.953,1.102 1.059,1.102 ; 0.97,-0.551 1.077,-0.551 ; 0.97,0.587 1.059,0.587 ; 0.97,1.085 1.077,1.085 ; 0.97,1.547 1.113,1.547 ; 0.988,-1.511 1.13,-1.511 ; 0.988,-1.049 1.095,-1.049 ; 0.988,-0.569 1.095,-0.569 ; 0.988,0.605 1.077,0.605 ; 0.988,1.067 1.113,1.067 ; 1.006,-1.031 1.113,-1.031 ; 1.006,-0.587 1.113,-0.587 ; 1.006,0.622 1.095,0.622 ; 1.006,1.529 1.13,1.529 ; 1.024,-1.494 1.148,-1.494 ; 1.024,-1.013 1.148,-1.013 ; 1.024,-0.605 1.13,-0.605 ; 1.024,0.64 1.113,0.64 ; 1.024,1.049 1.13,1.049 ; 1.041,-1.476 1.184,-1.476 ; 1.041,-0.622 1.148,-0.622 ; 1.041,0.658 1.13,0.658 ; 1.041,1.031 1.148,1.031 ; 1.041,1.511 1.166,1.511 ; 1.059,-0.996 1.166,-0.996 ; 1.059,-0.64 1.255,-0.64 ; 1.059,0.213 1.415,0.213 ; 1.059,0.676 1.219,0.676 ; 1.059,0.693 1.201,0.693 ; 1.059,1.013 1.166,1.013 ; 1.059,1.494 1.201,1.494 ; 1.077,-1.458 1.201,-1.458 ; 1.077,-0.978 1.184,-0.978 ; 1.077,-0.658 1.237,-0.658 ; 1.077,0.711 1.184,0.711 ; 1.077,0.996 1.184,0.996 ; 1.095,-0.96 1.201,-0.96 ; 1.095,-0.676 1.219,-0.676 ; 1.095,0.729 1.166,0.729 ; 1.095,0.978 1.201,0.978 ; 1.095,1.476 1.219,1.476 ; 1.113,-1.44 1.237,-1.44 ; 1.113,-0.942 1.201,-0.942 ; 1.113,0.747 1.166,0.747 ; 1.13,-1.422 1.255,-1.422 ; 1.13,-0.925 1.219,-0.925 ; 1.13,-0.693 1.201,-0.693 ; 1.13,0.96 1.219,0.96 ; 1.13,1.458 1.255,1.458 ; 1.148,-0.907 1.237,-0.907 ; 1.148,-0.711 1.184,-0.711 ; 1.148,0.658 1.237,0.658 ; 1.148,0.942 1.237,0.942 ; 1.148,1.44 1.273,1.44 ; 1.166,-1.405 1.29,-1.405 ; 1.166,-0.889 1.255,-0.889 ; 1.166,-0.622 1.255,-0.622 ; 1.166,0.64 1.255,0.64 ; 1.166,0.907 1.273,0.907 ; 1.166,0.925 1.255,0.925 ; 1.184,-1.387 1.308,-1.387 ; 1.184,-0.871 1.273,-0.871 ; 1.184,-0.605 1.273,-0.605 ; 1.184,0.605 1.273,0.605 ; 1.184,0.622 1.255,0.622 ; 1.184,0.889 1.29,0.889 ; 1.184,1.422 1.29,1.422 ; 1.201,-0.853 1.29,-0.853 ; 1.201,-0.587 1.29,-0.587 ; 1.201,0.587 1.29,0.587 ; 1.201,0.871 1.29,0.871 ; 1.201,1.405 1.326,1.405 ; 1.219,-1.369 1.326,-1.369 ; 1.219,-0.836 1.308,-0.836 ; 1.219,-0.569 1.29,-0.569 ; 1.219,-0.551 1.308,-0.551 ; 1.219,0.569 1.29,0.569 ; 1.219,0.853 1.308,0.853 ; 1.237,-1.351 1.344,-1.351 ; 1.237,-0.818 1.308,-0.818 ; 1.237,-0.8 1.326,-0.8 ; 1.237,-0.533 1.326,-0.533 ; 1.237,0.533 1.326,0.533 ; 1.237,0.551 1.308,0.551 ; 1.237,0.836 1.326,0.836 ; 1.237,1.387 1.344,1.387 ; 1.255,-1.333 1.379,-1.333 ; 1.255,-0.782 1.344,-0.782 ; 1.255,-0.516 1.326,-0.516 ; 1.255,-0.498 1.326,-0.498 ; 1.255,0.498 1.344,0.498 ; 1.255,0.516 1.326,0.516 ; 1.255,0.8 1.344,0.8 ; 1.255,0.818 1.344,0.818 ; 1.255,1.369 1.361,1.369 ; 1.273,-0.765 1.361,-0.765 ; 1.273,-0.48 1.344,-0.48 ; 1.273,-0.462 1.344,-0.462 ; 1.273,-0.445 1.361,-0.445 ; 1.273,-0.107 1.397,-0.107 ; 1.273,0.462 1.361,0.462 ; 1.273,0.48 1.344,0.48 ; 1.273,0.782 1.361,0.782 ; 1.273,1.351 1.379,1.351 ; 1.29,-1.316 1.397,-1.316 ; 1.29,-0.747 1.361,-0.747 ; 1.29,-0.729 1.379,-0.729 ; 1.29,-0.427 1.361,-0.427 ; 1.29,-0.409 1.361,-0.409 ; 1.29,-0.391 1.361,-0.391 ; 1.29,0.427 1.379,0.427 ; 1.29,0.445 1.361,0.445 ; 1.29,0.765 1.379,0.765 ; 1.29,1.333 1.397,1.333 ; 1.308,-1.298 1.415,-1.298 ; 1.308,-0.711 1.397,-0.711 ; 1.308,-0.373 1.379,-0.373 ; 1.308,-0.356 1.379,-0.356 ; 1.308,-0.338 1.379,-0.338 ; 1.308,-0.32 1.379,-0.32 ; 1.308,0.391 1.379,0.391 ; 1.308,0.409 1.379,0.409 ; 1.308,0.729 1.397,0.729 ; 1.308,0.747 1.379,0.747 ; 1.308,1.316 1.415,1.316 ; 1.326,-1.28 1.433,-1.28 ; 1.326,-0.693 1.397,-0.693 ; 1.326,-0.676 1.415,-0.676 ; 1.326,-0.302 1.379,-0.302 ; 1.326,-0.284 1.397,-0.284 ; 1.326,-0.267 1.397,-0.267 ; 1.326,-0.249 1.397,-0.249 ; 1.326,-0.231 1.397,-0.231 ; 1.326,-0.213 1.397,-0.213 ; 1.326,-0.196 1.397,-0.196 ; 1.326,-0.178 1.397,-0.178 ; 1.326,0.302 1.397,0.302 ; 1.326,0.32 1.397,0.32 ; 1.326,0.338 1.397,0.338 ; 1.326,0.356 1.397,0.356 ; 1.326,0.373 1.397,0.373 ; 1.326,0.711 1.415,0.711 ; 1.344,-1.262 1.45,-1.262 ; 1.344,-0.658 1.415,-0.658 ; 1.344,-0.64 1.433,-0.64 ; 1.344,0.231 1.415,0.231 ; 1.344,0.249 1.415,0.249 ; 1.344,0.267 1.415,0.267 ; 1.344,0.284 1.397,0.284 ; 1.344,0.676 1.433,0.676 ; 1.344,0.693 1.415,0.693 ; 1.344,1.298 1.433,1.298 ; 1.361,-1.245 1.468,-1.245 ; 1.361,-0.622 1.45,-0.622 ; 1.361,0.64 1.45,0.64 ; 1.361,0.658 1.433,0.658 ; 1.361,1.28 1.45,1.28 ; 1.379,-1.227 1.486,-1.227 ; 1.379,-0.605 1.45,-0.605 ; 1.379,-0.587 1.468,-0.587 ; 1.379,0.605 1.468,0.605 ; 1.379,0.622 1.45,0.622 ; 1.379,1.262 1.486,1.262 ; 1.397,-0.569 1.468,-0.569 ; 1.397,-0.551 1.468,-0.551 ; 1.397,0.569 1.486,0.569 ; 1.397,0.587 1.468,0.587 ; 1.397,1.245 1.486,1.245 ; 1.415,-1.209 1.504,-1.209 ; 1.415,-0.533 1.486,-0.533 ; 1.415,-0.516 1.486,-0.516 ; 1.415,0.533 1.486,0.533 ; 1.415,0.551 1.486,0.551 ; 1.415,1.227 1.504,1.227 ; 1.433,-1.191 1.521,-1.191 ; 1.433,-0.498 1.504,-0.498 ; 1.433,-0.48 1.504,-0.48 ; 1.433,-0.462 1.521,-0.462 ; 1.433,0.48 1.521,0.48 ; 1.433,0.498 1.504,0.498 ; 1.433,0.516 1.504,0.516 ; 1.433,1.209 1.521,1.209 ; 1.45,-1.173 1.539,-1.173 ; 1.45,-1.156 1.557,-1.156 ; 1.45,-0.445 1.521,-0.445 ; 1.45,-0.427 1.521,-0.427 ; 1.45,-0.409 1.539,-0.409 ; 1.45,0.445 1.521,0.445 ; 1.45,0.462 1.521,0.462 ; 1.45,1.191 1.539,1.191 ; 1.468,-1.138 1.575,-1.138 ; 1.468,-0.391 1.539,-0.391 ; 1.468,-0.373 1.539,-0.373 ; 1.468,-0.356 1.539,-0.356 ; 1.468,0.391 1.539,0.391 ; 1.468,0.409 1.539,0.409 ; 1.468,0.427 1.539,0.427 ; 1.468,1.173 1.557,1.173 ; 1.486,-1.12 1.593,-1.12 ; 1.486,-0.338 1.557,-0.338 ; 1.486,-0.32 1.557,-0.32 ; 1.486,-0.302 1.557,-0.302 ; 1.486,-0.284 1.557,-0.284 ; 1.486,0.32 1.557,0.32 ; 1.486,0.338 1.557,0.338 ; 1.486,0.356 1.557,0.356 ; 1.486,0.373 1.539,0.373 ; 1.486,1.156 1.575,1.156 ; 1.504,-1.102 1.593,-1.102 ; 1.504,-0.267 1.575,-0.267 ; 1.504,-0.249 1.575,-0.249 ; 1.504,-0.231 1.575,-0.231 ; 1.504,-0.213 1.575,-0.213 ; 1.504,-0.196 1.575,-0.196 ; 1.504,0.213 1.575,0.213 ; 1.504,0.231 1.575,0.231 ; 1.504,0.249 1.575,0.249 ; 1.504,0.267 1.575,0.267 ; 1.504,0.284 1.575,0.284 ; 1.504,0.302 1.575,0.302 ; 1.504,1.138 1.593,1.138 ; 1.521,-1.085 1.61,-1.085 ; 1.521,-0.178 1.593,-0.178 ; 1.521,-0.16 1.593,-0.16 ; 1.521,-0.142 1.593,-0.142 ; 1.521,-0.124 1.593,-0.124 ; 1.521,-0.107 1.593,-0.107 ; 1.521,-0.089 1.593,-0.089 ; 1.521,-0.071 1.593,-0.071 ; 1.521,-0.053 1.593,-0.053 ; 1.521,-0.036 1.593,-0.036 ; 1.521,-0.018 1.593,-0.018 ; 1.521,0 1.593,0 ; 1.521,0.018 1.593,0.018 ; 1.521,0.036 1.593,0.036 ; 1.521,0.053 1.593,0.053 ; 1.521,0.071 1.593,0.071 ; 1.521,0.089 1.593,0.089 ; 1.521,0.107 1.593,0.107 ; 1.521,0.124 1.593,0.124 ; 1.521,0.142 1.593,0.142 ; 1.521,0.16 1.593,0.16 ; 1.521,0.178 1.593,0.178 ; 1.521,0.196 1.593,0.196 ; 1.521,1.12 1.61,1.12 ; 1.539,-1.067 1.628,-1.067 ; 1.539,1.085 1.628,1.085 ; 1.539,1.102 1.61,1.102 ; 1.557,-1.049 1.646,-1.049 ; 1.557,-1.031 1.646,-1.031 ; 1.557,1.067 1.646,1.067 ; 1.575,-1.013 1.664,-1.013 ; 1.575,1.049 1.664,1.049 ; 1.593,-0.996 1.681,-0.996 ; 1.593,1.013 1.681,1.013 ; 1.593,1.031 1.664,1.031 ; 1.61,-0.978 1.681,-0.978 ; 1.61,-0.96 1.699,-0.96 ; 1.61,0.996 1.699,0.996 ; 1.628,-0.942 1.717,-0.942 ; 1.628,0.978 1.699,0.978 ; 1.646,-0.925 1.717,-0.925 ; 1.646,-0.907 1.735,-0.907 ; 1.646,0.942 1.735,0.942 ; 1.646,0.96 1.717,0.96 ; 1.664,-0.889 1.753,-0.889 ; 1.664,0.907 1.753,0.907 ; 1.664,0.925 1.735,0.925 ; 1.681,-0.871 1.753,-0.871 ; 1.681,-0.853 1.77,-0.853 ; 1.681,0.889 1.77,0.889 ; 1.699,-0.836 1.77,-0.836 ; 1.699,-0.818 1.788,-0.818 ; 1.699,0.853 1.788,0.853 ; 1.699,0.871 1.77,0.871 ; 1.717,-0.8 1.788,-0.8 ; 1.717,0.818 1.806,0.818 ; 1.717,0.836 1.788,0.836 ; 1.735,-0.782 1.806,-0.782 ; 1.735,-0.765 1.806,-0.765 ; 1.735,0.782 1.824,0.782 ; 1.735,0.8 1.806,0.8 ; 1.753,-0.747 1.824,-0.747 ; 1.753,-0.729 1.824,-0.729 ; 1.753,0.747 1.841,0.747 ; 1.753,0.765 1.824,0.765 ; 1.77,-0.711 1.841,-0.711 ; 1.77,-0.693 1.841,-0.693 ; 1.77,0.711 1.841,0.711 ; 1.77,0.729 1.841,0.729 ; 1.788,-0.676 1.859,-0.676 ; 1.788,-0.658 1.859,-0.658 ; 1.788,-0.64 1.859,-0.64 ; 1.788,0.676 1.859,0.676 ; 1.788,0.693 1.859,0.693 ; 1.806,-0.622 1.877,-0.622 ; 1.806,-0.605 1.877,-0.605 ; 1.806,0.622 1.877,0.622 ; 1.806,0.64 1.877,0.64 ; 1.806,0.658 1.877,0.658 ; 1.824,-0.587 1.895,-0.587 ; 1.824,-0.569 1.895,-0.569 ; 1.824,-0.551 1.895,-0.551 ; 1.824,0.569 1.895,0.569 ; 1.824,0.587 1.895,0.587 ; 1.824,0.605 1.895,0.605 ; 1.841,-0.533 1.913,-0.533 ; 1.841,-0.516 1.913,-0.516 ; 1.841,-0.498 1.913,-0.498 ; 1.841,0.516 1.913,0.516 ; 1.841,0.533 1.913,0.533 ; 1.841,0.551 1.913,0.551 ; 1.859,-0.48 1.93,-0.48 ; 1.859,-0.462 1.93,-0.462 ; 1.859,-0.445 1.93,-0.445 ; 1.859,-0.427 1.93,-0.427 ; 1.859,0.462 1.93,0.462 ; 1.859,0.48 1.93,0.48 ; 1.859,0.498 1.93,0.498 ; 1.877,-0.409 1.948,-0.409 ; 1.877,-0.391 1.948,-0.391 ; 1.877,-0.373 1.948,-0.373 ; 1.877,-0.356 1.948,-0.356 ; 1.877,0.391 1.948,0.391 ; 1.877,0.409 1.948,0.409 ; 1.877,0.427 1.948,0.427 ; 1.877,0.445 1.948,0.445 ; 1.895,-0.338 1.966,-0.338 ; 1.895,-0.32 1.966,-0.32 ; 1.895,-0.302 1.966,-0.302 ; 1.895,-0.284 1.966,-0.284 ; 1.895,-0.267 1.966,-0.267 ; 1.895,0.284 1.966,0.284 ; 1.895,0.302 1.966,0.302 ; 1.895,0.32 1.966,0.32 ; 1.895,0.338 1.966,0.338 ; 1.895,0.356 1.966,0.356 ; 1.895,0.373 1.948,0.373 ; 1.913,-0.249 1.966,-0.249 ; 1.913,-0.231 1.984,-0.231 ; 1.913,-0.213 1.984,-0.213 ; 1.913,-0.196 1.984,-0.196 ; 1.913,-0.178 1.984,-0.178 ; 1.913,-0.16 1.984,-0.16 ; 1.913,-0.142 1.984,-0.142 ; 1.913,-0.124 1.984,-0.124 ; 1.913,-0.107 1.984,-0.107 ; 1.913,0.142 1.984,0.142 ; 1.913,0.16 1.984,0.16 ; 1.913,0.178 1.984,0.178 ; 1.913,0.196 1.984,0.196 ; 1.913,0.213 1.984,0.213 ; 1.913,0.231 1.984,0.231 ; 1.913,0.249 1.984,0.249 ; 1.913,0.267 1.984,0.267 ; 1.93,-0.089 1.984,-0.089 ; 1.93,-0.071 1.984,-0.071 ; 1.93,-0.053 1.984,-0.053 ; 1.93,-0.036 1.984,-0.036 ; 1.93,-0.018 2.002,-0.018 ; 1.93,0 2.002,0 ; 1.93,0.018 2.002,0.018 ; 1.93,0.036 2.002,0.036 ; 1.93,0.053 1.984,0.053 ; 1.93,0.071 1.984,0.071 ; 1.93,0.089 1.984,0.089 ; 1.93,0.107 1.984,0.107 ; 1.93,0.124 1.984,0.124

## LOGO_wifi [mm]
Top Overlay:
  drawing of 234 lines, arcs and shapes, not listed